# Altium footprint library MercurialSDR.PcbLib: 77 footprints (part 3 of 5)
Each footprint in its own frame and in the unit in brackets; x right, y up, seen from the top. Pads: shape width x height; smd on the part's side, far side on the other; paste and mask are expansions set on the pad; w line width, h text height; cw(c..) or ccw(c..) is an arc to the next point about the centre after c.
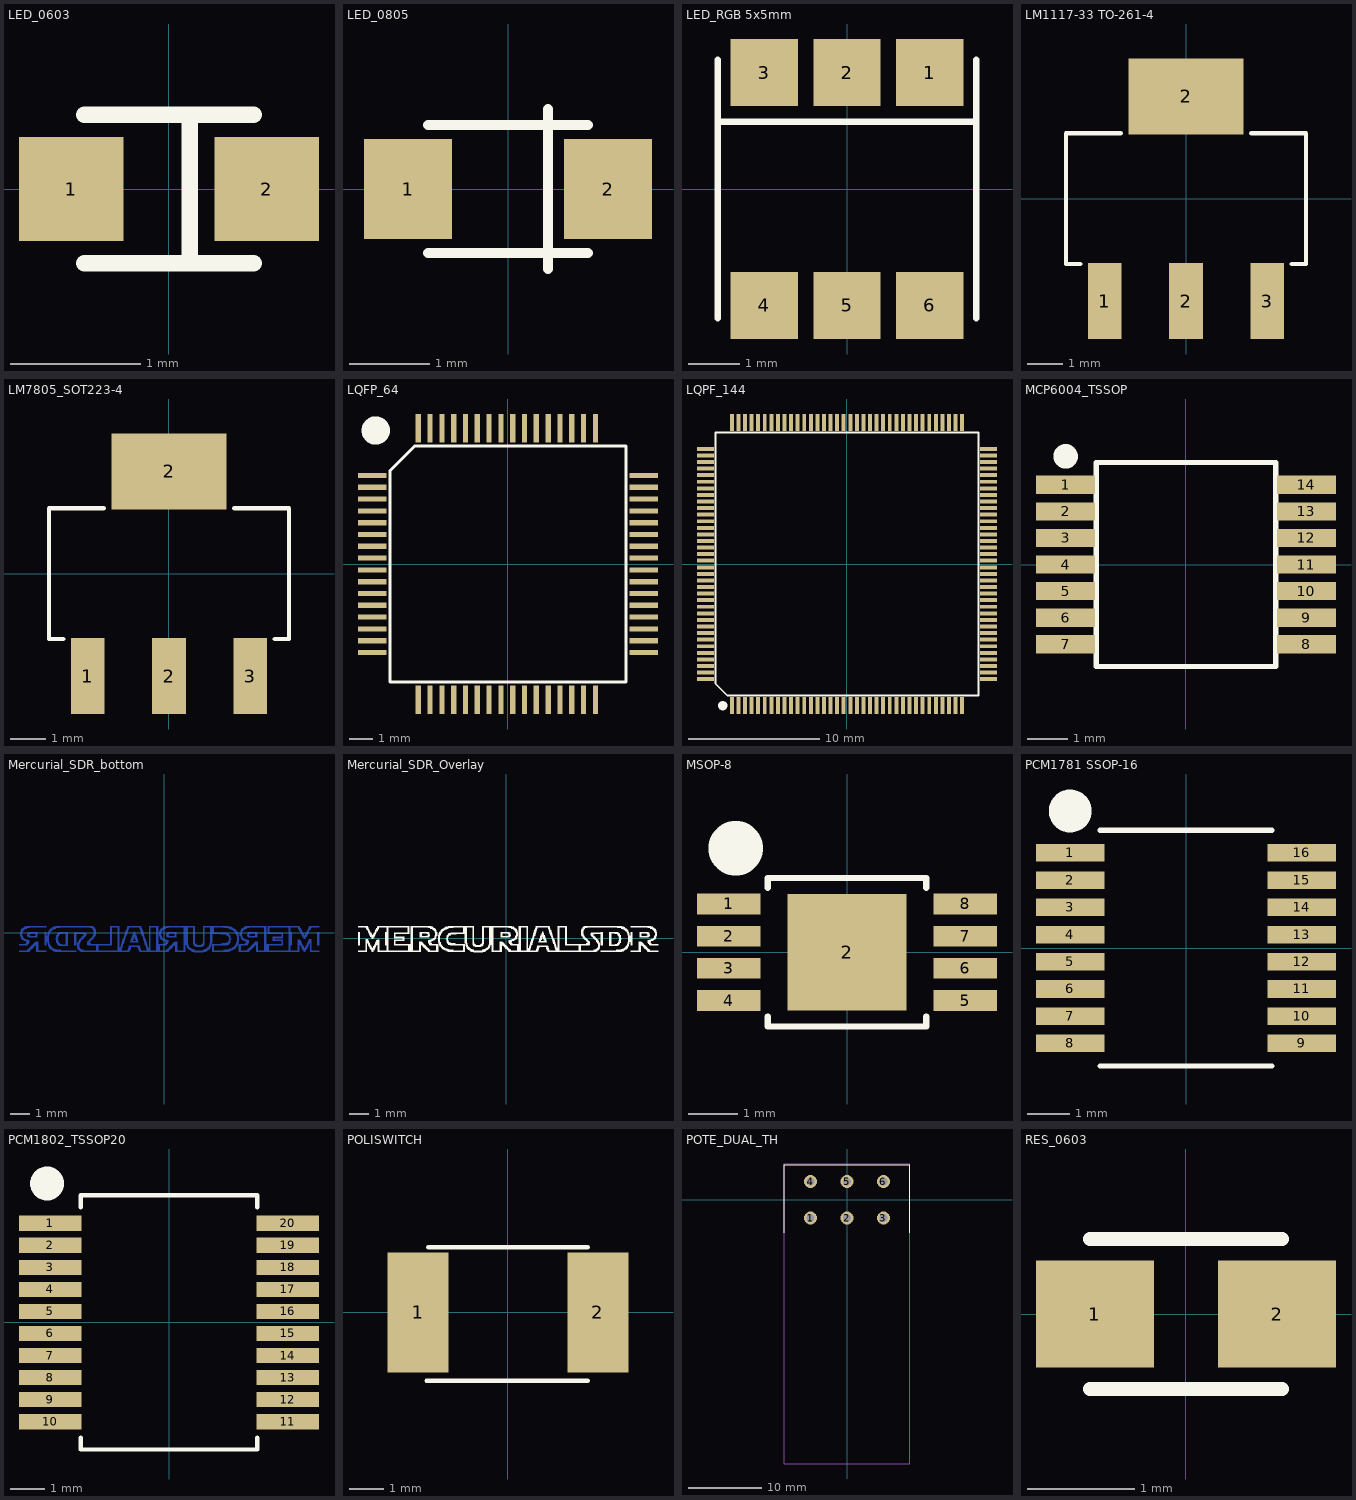
[diagram p2: the footprints below, top view; thin cyan lines are the x and y axes]

## LED_0603 [mm] "Led_0603"
pads (2):
  rect 0.8x0.8 smd: 1(-0.75,0) 2(0.75,0)
Top Overlay:
  lines w0.127: -0.65,-0.57 0.65,-0.57 ; -0.65,0.57 0.65,0.57 ; 0.16,-0.57 0.16,0.57
3D body "User Library-LED SMD 0603.step": height 0.65, standoff 0, extent -0.82,-0.4 0.88,0.4

## LED_0805 [mm] "Led 0805"
pads (2):
  rect 1.1x1.25 smd: 1(-1.25,0) 2(1.25,0)
Top Overlay:
  lines w0.127: -1,-0.8 1,-0.8 ; -1,0.8 1,0.8 ; 0.5,-1 0.5,1 ; 0.5,-0.75 0.5,0.7
3D body "User Library-LED-0805.step": height 0.9, standoff -0.01, extent -1.05,-0.675 1.05,0.675

## LED_RGB 5x5mm [mm] "Led RGB 5mm x 5mm"
pads (6):
  rect 1.3x1.3 smd: 1(1.6,2.25) 2(0,2.25) 3(-1.6,2.25) 4(-1.6,-2.25) 5(0,-2.25) 6(1.6,-2.25)
Top Overlay:
  lines w0.127: -2.5,-2.5 -2.5,2.5 ; -2.5,1.3 2.5,1.3 ; 2.5,-2.5 2.5,2.5
3D body "User Library-5050 RGB led.STEP": height 1.6, standoff 0, extent -2.45,-2.77 2.65,2.77

## LM1117-33 TO-261-4 [mm] "Regulador Lineal LM1117-33 TO-261-4"
pads (4):
  rect 0.95x2.15 smd: 1(-2.3,-2.9) 2(0,-2.9) 3(2.3,-2.9)
  rect 3.25x2.15 smd: 2(0,2.9)
Top Overlay:
  lines w0.127: -3,-1.85 -3.4,-1.85 -3.4,1.85 -1.85,1.85 ; 1.85,1.85 3.4,1.85 3.4,-1.85 3,-1.85
3D body "User Library- LM1117-SOT-223-1.step": height 1.69, standoff 0.04, extent -3.25,-3.5 3.25,3.5

## LM7805_SOT223-4 [mm] "Regulador Lineal 7805 SOT223-4"
pads (4):
  rect 0.95x2.15 smd: 1(-2.3,-2.9) 2(0,-2.9) 3(2.3,-2.9)
  rect 3.25x2.15 smd: 2(0,2.9)
Top Overlay:
  lines w0.127: -3,-1.85 -3.4,-1.85 -3.4,1.85 -1.85,1.85 ; 1.85,1.85 3.4,1.85 3.4,-1.85 3,-1.85
3D body "User Library- LM1117-SOT-223-1.step": height 1.69, standoff 0.04, extent -3.25,-3.5 3.25,3.5

## LQFP_64 [mm]
pads (64):
  rect 1.2x0.22 smd: 1(-5.75,3.75) 2(-5.75,3.25) 3(-5.75,2.75) 4(-5.75,2.25) 5(-5.75,1.75) 6(-5.75,1.25) 7(-5.75,0.75) 8(-5.75,0.25) 9(-5.75,-0.25) 10(-5.75,-0.75) 11(-5.75,-1.25) 12(-5.75,-1.75) 13(-5.75,-2.25) 14(-5.75,-2.75) 15(-5.75,-3.25) 16(-5.75,-3.75) 33(5.75,-3.75) 34(5.75,-3.25) 35(5.75,-2.75) 36(5.75,-2.25) 37(5.75,-1.75) 38(5.75,-1.25) 39(5.75,-0.75) 40(5.75,-0.25) 41(5.75,0.25) 42(5.75,0.75) 43(5.75,1.25) 44(5.75,1.75) 45(5.75,2.25) 46(5.75,2.75) 47(5.75,3.25) 48(5.75,3.75)
  rect 0.22x1.2 smd: 17(-3.8,-5.75) 18(-3.3,-5.75) 19(-2.8,-5.75) 20(-2.3,-5.75) 21(-1.8,-5.75) 22(-1.3,-5.75) 23(-0.8,-5.75) 24(-0.3,-5.75) 25(0.2,-5.75) 26(0.7,-5.75) 27(1.2,-5.75) 28(1.7,-5.75) 29(2.2,-5.75) 30(2.7,-5.75) 31(3.2,-5.75) 32(3.7,-5.75) 49(3.7,5.75) 50(3.2,5.75) 51(2.7,5.75) 52(2.2,5.75) 53(1.7,5.75) 54(1.2,5.75) 55(0.7,5.75) 56(0.2,5.75) 57(-0.3,5.75) 58(-0.8,5.75) 59(-1.3,5.75) 60(-1.8,5.75) 61(-2.3,5.75) 62(-2.8,5.75) 63(-3.3,5.75) 64(-3.8,5.75)
Top Overlay:
  circle w0.6: c-5.6,5.65 r0.3
  lines w0.127: 3.7,-5 5,-5 5,-3.65 5,5 -3.95,5 -5,3.95 -5,-3.8 -5,-5 3.75,-5
3D body "User Library-LQFP64-2.STEP": height 1.62, standoff -0.01, extent -6.122,-6.072 6.022,6.072

## LQPF_144 [mm] "LQPF_144"
height 0.002
pads (144):
  rect 0.3x1.3 smd: 1(-8.75,-10.75) 2(-8.25,-10.75) 3(-7.75,-10.75) 4(-7.25,-10.75) 5(-6.75,-10.75) 6(-6.25,-10.75) 7(-5.75,-10.75) 8(-5.25,-10.75) 9(-4.75,-10.75) 10(-4.25,-10.75) 11(-3.75,-10.75) 12(-3.25,-10.75) 13(-2.75,-10.75) 14(-2.25,-10.75) 15(-1.75,-10.75) 16(-1.25,-10.75) 17(-0.75,-10.75) 18(-0.25,-10.75) 19(0.25,-10.75) 20(0.75,-10.75) 21(1.25,-10.75) 22(1.75,-10.75) 23(2.25,-10.75) 24(2.75,-10.75) 25(3.25,-10.75) 26(3.75,-10.75) 27(4.25,-10.75) 28(4.75,-10.75) 29(5.25,-10.75) 30(5.75,-10.75) 31(6.25,-10.75) 32(6.75,-10.75) 33(7.25,-10.75) 34(7.75,-10.75) 35(8.25,-10.75) 36(8.75,-10.75) 73(8.75,10.75) 74(8.25,10.75) 75(7.75,10.75) 76(7.25,10.75) 77(6.75,10.75) 78(6.25,10.75) 79(5.75,10.75) 80(5.25,10.75) 81(4.75,10.75) 82(4.25,10.75) 83(3.75,10.75) 84(3.25,10.75) 85(2.75,10.75) 86(2.25,10.75) 87(1.75,10.75) 88(1.25,10.75) 89(0.75,10.75) 90(0.25,10.75) 91(-0.25,10.75) 92(-0.75,10.75) 93(-1.25,10.75) 94(-1.75,10.75) 95(-2.25,10.75) 96(-2.75,10.75) 97(-3.25,10.75) 98(-3.75,10.75) 99(-4.25,10.75) 100(-4.75,10.75) 101(-5.25,10.75) 102(-5.75,10.75) 103(-6.25,10.75) 104(-6.75,10.75) 105(-7.25,10.75) 106(-7.75,10.75) 107(-8.25,10.75) 108(-8.75,10.75)
  rect 1.3x0.3 smd: 37(10.75,-8.75) 38(10.75,-8.25) 39(10.75,-7.75) 40(10.75,-7.25) 41(10.75,-6.75) 42(10.75,-6.25) 43(10.75,-5.75) 44(10.75,-5.25) 45(10.75,-4.75) 46(10.75,-4.25) 47(10.75,-3.75) 48(10.75,-3.25) 49(10.75,-2.75) 50(10.75,-2.25) 51(10.75,-1.75) 52(10.75,-1.25) 53(10.75,-0.75) 54(10.75,-0.25) 55(10.75,0.25) 56(10.75,0.75) 57(10.75,1.25) 58(10.75,1.75) 59(10.75,2.25) 60(10.75,2.75) 61(10.75,3.25) 62(10.75,3.75) 63(10.75,4.25) 64(10.75,4.75) 65(10.75,5.25) 66(10.75,5.75) 67(10.75,6.25) 68(10.75,6.75) 69(10.75,7.25) 70(10.75,7.75) 71(10.75,8.25) 72(10.75,8.75) 109(-10.75,8.75) 110(-10.75,8.25) 111(-10.75,7.75) 112(-10.75,7.25) 113(-10.75,6.75) 114(-10.75,6.25) 115(-10.75,5.75) 116(-10.75,5.25) 117(-10.75,4.75) 118(-10.75,4.25) 119(-10.75,3.75) 120(-10.75,3.25) 121(-10.75,2.75) 122(-10.75,2.25) 123(-10.75,1.75) 124(-10.75,1.25) 125(-10.75,0.75) 126(-10.75,0.25) 127(-10.75,-0.25) 128(-10.75,-0.75) 129(-10.75,-1.25) 130(-10.75,-1.75) 131(-10.75,-2.25) 132(-10.75,-2.75) 133(-10.75,-3.25) 134(-10.75,-3.75) 135(-10.75,-4.25) 136(-10.75,-4.75) 137(-10.75,-5.25) 138(-10.75,-5.75) 139(-10.75,-6.25) 140(-10.75,-6.75) 141(-10.75,-7.25) 142(-10.75,-7.75) 143(-10.75,-8.25) 144(-10.75,-8.75)
Top Overlay:
  lines w0.127: -10,-9.1 -9.1,-10 10,-10 10,10 -10,10 -10,8.75 -10,-9.1
  lines w0.7: -9.451,-10.773 ccw(c-9.75,-10.75) -9.45,-10.75
3D body "User Library-LQFP144_STM32F4.STEP": height 2, standoff 0.1, extent -11,-11 11,11

## MCP6004_TSSOP [mm] "TSSOP de MCP6004"
pads (14):
  rect 1.45x0.45 smd: 1(-2.95,1.95) 2(-2.95,1.3) 3(-2.95,0.65) 4(-2.95,0) 5(-2.95,-0.65) 6(-2.95,-1.3) 7(-2.95,-1.95) 8(2.95,-1.95) 9(2.95,-1.3) 10(2.95,-0.65) 11(2.95,0) 12(2.95,0.65) 13(2.95,1.3) 14(2.95,1.95)
Top Overlay:
  circle w0.5: c-2.95,2.65 r0.05
  lines w0.127: -2.2,-2.5 2.2,-2.5 2.2,2.5 -2.2,2.5 -2.2,-2.5
3D body "User Library-TSSOP-14.STEP": height 1.2, standoff 0, extent -3.15,-2.5 3.25,2.5

## Mercurial_SDR_bottom [mm]
Bottom Layer:
  lines w0.03: -7.461,-0.95 -6.942,-0.95 ; -7.461,-0.919 -6.912,-0.919 ; -7.461,-0.614 -7.034,-0.614 ; -7.461,-0.584 -7.003,-0.584 ; -7.4,-0.127 -7.308,-0.127 ; -7.4,-0.096 -7.308,-0.096 ; -7.4,-0.066 -7.308,-0.066 ; -7.4,-0.035 -7.308,-0.035 ; -7.4,-0.005 -7.308,-0.005 ; -7.4,0.026 -7.308,0.026 ; -7.369,-0.218 -7.278,-0.218 ; -7.369,-0.188 -7.278,-0.188 ; -7.369,-0.157 -7.278,-0.157 ; -7.369,0.056 -7.278,0.056 ; -7.369,0.087 -7.278,0.087 ; -7.369,0.117 -7.247,0.117 ; -7.339,-0.279 -7.217,-0.279 ; -7.339,-0.249 -7.247,-0.249 ; -7.339,0.148 -7.217,0.148 ; -7.339,0.178 -7.186,0.178 ; -7.308,-0.31 -7.186,-0.31 ; -7.308,0.209 -7.156,0.209 ; -7.278,-0.34 -7.125,-0.34 ; -7.278,0.239 -7.064,0.239 ; -7.247,-0.371 -7.034,-0.371 ; -7.217,0.27 -6.942,0.27 ; -7.186,-0.401 -6.942,-0.401 ; -7.186,0.3 -6.059,0.3 ; -7.125,-0.553 -6.973,-0.553 ; -7.095,-0.523 -6.973,-0.523 ; -7.095,-0.432 -6.942,-0.432 ; -7.095,0.33 -6.059,0.33 ; -7.064,-0.492 -6.942,-0.492 ; -7.034,-0.889 -6.882,-0.889 ; -7.034,-0.462 -6.942,-0.462 ; -7.034,-0.127 -6.942,-0.127 ; -7.034,-0.096 -6.942,-0.096 ; -7.003,-0.858 -6.851,-0.858 ; -7.003,-0.188 -6.516,-0.188 ; -7.003,-0.157 -6.882,-0.157 ; -7.003,-0.066 -6.912,-0.066 ; -7.003,-0.035 -6.882,-0.035 ; -7.003,-0.005 -6.516,-0.005 ; -6.973,-0.828 -6.821,-0.828 ; -6.973,-0.218 -6.516,-0.218 ; -6.973,0.026 -6.516,0.026 ; -6.942,-0.797 -6.79,-0.797 ; -6.912,-0.767 -6.76,-0.767 ; -6.882,-0.736 -6.729,-0.736 ; -6.851,-0.706 -6.699,-0.706 ; -6.821,-0.675 -6.668,-0.675 ; -6.79,-0.645 -6.638,-0.645 ; -6.76,-0.614 -6.607,-0.614 ; -6.729,-0.584 -6.485,-0.584 ; -6.699,-0.553 -6.485,-0.553 ; -6.668,-0.523 -6.485,-0.523 ; -6.638,-0.492 -6.485,-0.492 ; -6.607,-0.462 -6.485,-0.462 ; -6.607,-0.157 -6.516,-0.157 ; -6.607,-0.127 -6.516,-0.127 ; -6.607,-0.096 -6.516,-0.096 ; -6.607,-0.066 -6.516,-0.066 ; -6.607,-0.035 -6.516,-0.035 ; -6.577,-0.95 -6.059,-0.95 ; -6.577,-0.919 -6.059,-0.919 ; -6.577,-0.889 -6.485,-0.889 ; -6.577,-0.858 -6.485,-0.858 ; -6.577,-0.828 -6.485,-0.828 ; -6.577,-0.797 -6.485,-0.797 ; -6.577,-0.767 -6.485,-0.767 ; -6.577,-0.736 -6.485,-0.736 ; -6.577,-0.706 -6.485,-0.706 ; -6.577,-0.675 -6.485,-0.675 ; -6.577,-0.645 -6.485,-0.645 ; -6.577,-0.614 -6.485,-0.614 ; -6.15,-0.614 -6.059,-0.614 ; -6.15,-0.584 -6.059,-0.584 ; -6.15,-0.553 -6.059,-0.553 ; -6.15,-0.523 -6.059,-0.523 ; -6.15,-0.492 -6.059,-0.492 ; -6.15,-0.462 -6.059,-0.462 ; -6.15,-0.432 -6.059,-0.432 ; -6.15,-0.401 -6.059,-0.401 ; -6.15,-0.371 -6.059,-0.371 ; -6.15,-0.34 -6.059,-0.34 ; -6.15,-0.31 -6.059,-0.31 ; -6.15,-0.279 -6.059,-0.279 ; -6.15,-0.249 -6.059,-0.249 ; -6.15,-0.218 -6.059,-0.218 ; -6.15,-0.188 -6.059,-0.188 ; -6.15,-0.157 -6.059,-0.157 ; -6.15,-0.127 -6.059,-0.127 ; -6.15,-0.096 -6.059,-0.096 ; -6.15,-0.066 -6.059,-0.066 ; -6.15,-0.035 -6.059,-0.035 ; -6.15,-0.005 -6.059,-0.005 ; -6.15,0.026 -6.059,0.026 ; -6.028,-0.432 -5.937,-0.432 ; -6.028,-0.401 -5.937,-0.401 ; -6.028,-0.371 -5.937,-0.371 ; -6.028,-0.34 -5.937,-0.34 ; -6.028,-0.31 -5.937,-0.31 ; -6.028,-0.279 -5.937,-0.279 ; -6.028,-0.249 -5.937,-0.249 ; -6.028,-0.218 -5.937,-0.218 ; -6.028,-0.188 -5.937,-0.188 ; -6.028,-0.157 -5.937,-0.157 ; -5.998,-0.553 -5.906,-0.553 ; -5.998,-0.523 -5.906,-0.523 ; -5.998,-0.492 -5.906,-0.492 ; -5.998,-0.462 -5.937,-0.462 ; -5.998,-0.127 -5.937,-0.127 ; -5.998,-0.096 -5.906,-0.096 ; -5.998,-0.066 -5.906,-0.066 ; -5.998,-0.035 -5.906,-0.035 ; -5.967,-0.645 -5.845,-0.645 ; -5.967,-0.614 -5.876,-0.614 ; -5.967,-0.584 -5.876,-0.584 ; -5.967,-0.005 -5.876,-0.005 ; -5.967,0.026 -5.876,0.026 ; -5.937,-0.706 -5.815,-0.706 ; -5.937,-0.675 -5.845,-0.675 ; -5.937,0.056 -5.845,0.056 ; -5.937,0.087 -5.815,0.087 ; -5.906,-0.736 -5.784,-0.736 ; -5.906,0.117 -5.784,0.117 ; -5.876,-0.797 -5.723,-0.797 ; -5.876,-0.767 -5.754,-0.767 ; -5.876,0.148 -5.754,0.148 ; -5.876,0.178 -5.723,0.178 ; -5.845,-0.828 -5.662,-0.828 ; -5.845,0.209 -5.662,0.209 ; -5.784,-0.858 -5.571,-0.858 ; -5.784,0.239 -5.571,0.239 ; -5.754,-0.889 -5.327,-0.889 ; -5.754,0.27 -5.358,0.27 ; -5.693,-0.919 -4.535,-0.919 ; -5.693,0.3 -4.535,0.3 ; -5.601,-0.95 -4.535,-0.95 ; -5.601,0.33 -4.535,0.33 ; -5.571,-0.31 -5.479,-0.31 ; -5.571,-0.279 -5.479,-0.279 ; -5.54,-0.492 -5.418,-0.492 ; -5.54,-0.462 -5.449,-0.462 ; -5.54,-0.432 -5.449,-0.432 ; -5.54,-0.401 -5.449,-0.401 ; -5.54,-0.371 -5.479,-0.371 ; -5.54,-0.34 -5.479,-0.34 ; -5.54,-0.249 -5.479,-0.249 ; -5.54,-0.218 -5.449,-0.218 ; -5.54,-0.188 -5.449,-0.188 ; -5.54,-0.157 -5.449,-0.157 ; -5.54,-0.127 -5.418,-0.127 ; -5.51,-0.553 -5.358,-0.553 ; -5.51,-0.523 -5.418,-0.523 ; -5.51,-0.096 -5.388,-0.096 ; -5.51,-0.066 -5.358,-0.066 ; -5.479,-0.584 -5.266,-0.584 ; -5.479,-0.035 -5.236,-0.035 ; -5.449,-0.614 -4.961,-0.614 ; -5.449,-0.005 -4.961,-0.005 ; -5.388,-0.645 -4.961,-0.645 ; -5.388,0.026 -4.961,0.026 ; -5.053,-0.584 -4.961,-0.584 ; -5.053,-0.553 -4.961,-0.553 ; -5.053,-0.523 -4.961,-0.523 ; -5.053,-0.492 -4.961,-0.492 ; -5.053,-0.462 -4.961,-0.462 ; -5.053,-0.432 -4.961,-0.432 ; -5.053,-0.401 -4.961,-0.401 ; -5.053,-0.371 -4.961,-0.371 ; -5.053,-0.34 -4.961,-0.34 ; -5.053,-0.31 -4.961,-0.31 ; -5.053,-0.279 -4.961,-0.279 ; -5.053,-0.249 -4.961,-0.249 ; -5.053,-0.218 -4.961,-0.218 ; -5.053,-0.188 -4.961,-0.188 ; -5.053,-0.157 -4.961,-0.157 ; -5.053,-0.127 -4.961,-0.127 ; -5.053,-0.096 -4.961,-0.096 ; -5.053,-0.066 -4.961,-0.066 ; -5.053,-0.035 -4.961,-0.035 ; -4.626,-0.614 -4.535,-0.614 ; -4.626,-0.584 -4.535,-0.584 ; -4.626,-0.553 -4.535,-0.553 ; -4.626,-0.523 -4.535,-0.523 ; -4.626,-0.492 -4.535,-0.492 ; -4.626,-0.462 -4.535,-0.462 ; -4.626,-0.432 -4.535,-0.432 ; -4.626,-0.401 -4.535,-0.401 ; -4.626,-0.371 -4.535,-0.371 ; -4.626,-0.34 -4.535,-0.34 ; -4.626,-0.31 -4.535,-0.31 ; -4.626,-0.279 -4.535,-0.279 ; -4.626,-0.249 -4.535,-0.249 ; -4.626,-0.218 -4.535,-0.218 ; -4.626,-0.188 -4.535,-0.188 ; -4.626,-0.157 -4.535,-0.157 ; -4.626,-0.127 -4.535,-0.127 ; -4.626,-0.096 -4.535,-0.096 ; -4.626,-0.066 -4.535,-0.066 ; -4.626,-0.035 -4.535,-0.035 ; -4.626,-0.005 -4.535,-0.005 ; -4.626,0.026 -4.535,0.026 ; -4.504,-0.035 -4.016,-0.035 ; -4.504,-0.005 -4.047,-0.005 ; -4.504,0.3 -3.62,0.3 ; -4.504,0.33 -3.681,0.33 ; -4.474,-0.767 -4.352,-0.767 ; -4.474,-0.736 -4.382,-0.736 ; -4.474,-0.706 -4.382,-0.706 ; -4.474,-0.675 -4.382,-0.675 ; -4.474,-0.645 -4.382,-0.645 ; -4.474,-0.614 -4.382,-0.614 ; -4.474,-0.584 -4.382,-0.584 ; -4.474,-0.553 -4.382,-0.553 ; -4.443,-0.828 -4.291,-0.828 ; -4.443,-0.797 -4.352,-0.797 ; -4.443,-0.523 -4.352,-0.523 ; -4.443,-0.492 -4.352,-0.492 ; -4.413,-0.858 -4.26,-0.858 ; -4.413,-0.462 -4.321,-0.462 ; -4.413,-0.432 -4.291,-0.432 ; -4.382,-0.889 -4.169,-0.889 ; -4.382,-0.401 -4.291,-0.401 ; -4.382,-0.371 -4.26,-0.371 ; -4.352,-0.919 -1.791,-0.919 ; -4.352,-0.34 -4.23,-0.34 ; -4.321,-0.31 -4.199,-0.31 ; -4.291,-0.95 -1.791,-0.95 ; -4.291,-0.279 -4.169,-0.279 ; -4.26,-0.249 -4.138,-0.249 ; -4.23,-0.218 -4.108,-0.218 ; -4.199,-0.188 -4.077,-0.188 ; -4.199,-0.066 -4.016,-0.066 ; -4.169,-0.157 -4.047,-0.157 ; -4.138,-0.127 -4.047,-0.127 ; -4.108,-0.096 -4.016,-0.096 ; -3.955,-0.584 -2.706,-0.584 ; -3.955,-0.553 -3.773,-0.553 ; -3.955,-0.523 -3.864,-0.523 ; -3.955,-0.492 -3.864,-0.492 ; -3.955,-0.462 -3.834,-0.462 ; -3.925,-0.614 -2.706,-0.614 ; -3.925,-0.432 -3.803,-0.432 ; -3.894,-0.401 -3.773,-0.401 ; -3.864,-0.371 -3.742,-0.371 ; -3.834,-0.34 -3.712,-0.34 ; -3.834,0.27 -3.59,0.27 ; -3.803,-0.31 -3.681,-0.31 ; -3.773,-0.279 -3.651,-0.279 ; -3.742,-0.249 -3.62,-0.249 ; -3.712,-0.218 -3.59,-0.218 ; -3.712,0.239 -3.59,0.239 ; -3.681,-0.188 -3.59,-0.188 ; -3.681,-0.157 -3.559,-0.157 ; -3.681,0.209 -3.559,0.209 ; -3.651,-0.127 -3.559,-0.127 ; -3.651,-0.096 -3.529,-0.096 ; -3.651,0.148 -3.529,0.148 ; -3.651,0.178 -3.559,0.178 ; -3.62,-0.066 -3.529,-0.066 ; -3.62,-0.035 -3.529,-0.035 ; -3.62,-0.005 -3.529,-0.005 ; -3.62,0.026 -3.529,0.026 ; -3.62,0.056 -3.529,0.056 ; -3.62,0.087 -3.529,0.087 ; -3.62,0.117 -3.529,0.117 ; -3.498,-0.889 -3.407,-0.889 ; -3.498,-0.858 -3.407,-0.858 ; -3.498,-0.828 -3.407,-0.828 ; -3.498,-0.797 -3.407,-0.797 ; -3.498,-0.767 -3.407,-0.767 ; -3.498,-0.736 -3.407,-0.736 ; -3.498,-0.706 -3.407,-0.706 ; -3.498,-0.675 -3.407,-0.675 ; -3.498,-0.645 -3.407,-0.645 ; -2.767,-0.553 -2.706,-0.553 ; -2.767,-0.523 -2.706,-0.523 ; -2.767,-0.492 -2.706,-0.492 ; -2.767,-0.462 -2.706,-0.462 ; -2.767,-0.432 -2.706,-0.432 ; -2.767,-0.401 -2.706,-0.401 ; -2.767,-0.371 -2.706,-0.371 ; -2.767,-0.34 -2.706,-0.34 ; -2.767,-0.31 -2.706,-0.31 ; -2.767,-0.279 -2.706,-0.279 ; -2.767,-0.249 -2.706,-0.249 ; -2.767,-0.218 -2.706,-0.218 ; -2.767,-0.188 -2.706,-0.188 ; -2.767,-0.157 -2.706,-0.157 ; -2.767,-0.127 -2.706,-0.127 ; -2.767,-0.096 -2.706,-0.096 ; -2.767,-0.066 -2.706,-0.066 ; -2.767,-0.035 -2.706,-0.035 ; -2.767,-0.005 -2.706,-0.005 ; -2.767,0.026 -2.706,0.026 ; -2.767,0.056 -2.706,0.056 ; -2.767,0.087 -2.706,0.087 ; -2.767,0.117 -2.706,0.117 ; -2.767,0.148 -2.706,0.148 ; -2.767,0.178 -2.706,0.178 ; -2.767,0.209 -2.706,0.209 ; -2.767,0.239 -2.706,0.239 ; -2.767,0.27 -2.706,0.27 ; -2.767,0.3 -2.31,0.3 ; -2.767,0.33 -2.31,0.33 ; -2.401,-0.889 -2.218,-0.889 ; -2.401,-0.858 -2.218,-0.858 ; -2.401,-0.828 -2.31,-0.828 ; -2.401,-0.797 -2.31,-0.797 ; -2.401,-0.767 -2.31,-0.767 ; -2.401,-0.736 -2.31,-0.736 ; -2.401,-0.706 -2.31,-0.706 ; -2.401,-0.675 -2.31,-0.675 ; -2.401,-0.645 -2.31,-0.645 ; -2.401,-0.614 -2.31,-0.614 ; -2.401,-0.584 -2.31,-0.584 ; -2.401,-0.553 -2.31,-0.553 ; -2.401,-0.523 -2.31,-0.523 ; -2.401,-0.492 -2.31,-0.492 ; -2.401,-0.462 -2.31,-0.462 ; -2.401,-0.432 -2.31,-0.432 ; -2.401,-0.401 -2.31,-0.401 ; -2.401,-0.371 -2.31,-0.371 ; -2.401,-0.34 -2.31,-0.34 ; -2.401,-0.31 -2.31,-0.31 ; -2.401,-0.279 -2.31,-0.279 ; -2.401,-0.249 -2.31,-0.249 ; -2.401,-0.218 -2.31,-0.218 ; -2.401,-0.188 -2.31,-0.188 ; -2.401,-0.157 -2.31,-0.157 ; -2.401,-0.127 -2.31,-0.127 ; -2.401,-0.096 -2.31,-0.096 ; -2.401,-0.066 -2.31,-0.066 ; -2.401,-0.035 -2.31,-0.035 ; -2.401,-0.005 -2.31,-0.005 ; -2.401,0.026 -2.31,0.026 ; -2.401,0.056 -2.31,0.056 ; -2.401,0.087 -2.31,0.087 ; -2.401,0.117 -2.31,0.117 ; -2.401,0.148 -2.31,0.148 ; -2.401,0.178 -2.31,0.178 ; -2.401,0.209 -2.31,0.209 ; -2.401,0.239 -2.31,0.239 ; -2.401,0.27 -2.31,0.27 ; -2.279,-0.828 -2.188,-0.828 ; -2.279,-0.797 -2.188,-0.797 ; -2.279,-0.767 -2.188,-0.767 ; -2.249,-0.736 -2.157,-0.736 ; -2.249,-0.706 -2.157,-0.706 ; -2.249,-0.675 -2.157,-0.675 ; -2.218,-0.645 -2.127,-0.645 ; -2.218,-0.614 -2.127,-0.614 ; -2.218,-0.584 -2.127,-0.584 ; -2.188,-0.553 -2.096,-0.553 ; -2.188,-0.523 -2.096,-0.523 ; -2.188,-0.492 -2.096,-0.492 ; -2.157,-0.462 -2.066,-0.462 ; -2.157,-0.432 -2.066,-0.432 ; -2.157,-0.401 -2.066,-0.401 ; -2.127,-0.371 -2.035,-0.371 ; -2.127,-0.34 -2.035,-0.34 ; -2.127,-0.31 -2.035,-0.31 ; -2.096,-0.279 -2.005,-0.279 ; -2.096,-0.249 -2.005,-0.249 ; -2.066,-0.218 -2.005,-0.218 ; -2.066,-0.188 -1.974,-0.188 ; -2.066,-0.157 -1.974,-0.157 ; -2.035,-0.127 -1.974,-0.127 ; -2.035,-0.096 -1.944,-0.096 ; -2.035,-0.066 -1.944,-0.066 ; -2.005,-0.035 -1.913,-0.035 ; -2.005,-0.005 -1.913,-0.005 ; -2.005,0.026 -1.913,0.026 ; -1.974,0.056 -1.883,0.056 ; -1.974,0.087 -1.883,0.087 ; -1.974,0.117 -1.883,0.117 ; -1.944,0.148 -1.852,0.148 ; -1.944,0.178 -1.852,0.178 ; -1.944,0.209 -1.852,0.209 ; -1.913,0.239 -1.822,0.239 ; -1.913,0.27 -1.822,0.27 ; -1.913,0.3 -1.182,0.3 ; -1.883,-0.889 -1.761,-0.889 ; -1.883,0.33 -1.182,0.33 ; -1.852,-0.858 -1.761,-0.858 ; -1.852,-0.828 -1.761,-0.828 ; -1.852,-0.797 -1.73,-0.797 ; -1.822,-0.767 -1.73,-0.767 ; -1.822,-0.736 -1.73,-0.736 ; -1.822,-0.706 -1.273,-0.706 ; -1.791,-0.675 -1.273,-0.675 ; -1.761,-0.462 -1.334,-0.462 ; -1.73,-0.432 -1.334,-0.432 ; -1.73,-0.401 -1.639,-0.401 ; -1.73,-0.371 -1.608,-0.371 ; -1.7,-0.34 -1.608,-0.34 ; -1.7,-0.31 -1.608,-0.31 ; -1.669,-0.279 -1.578,-0.279 ; -1.669,-0.249 -1.578,-0.249 ; -1.669,-0.218 -1.578,-0.218 ; -1.639,-0.188 -1.426,-0.188 ; -1.639,-0.157 -1.456,-0.157 ; -1.639,-0.127 -1.456,-0.127 ; -1.608,-0.096 -1.456,-0.096 ; -1.608,-0.066 -1.487,-0.066 ; -1.608,-0.035 -1.487,-0.035 ; -1.578,-0.005 -1.517,-0.005 ; -1.578,0.026 -1.517,0.026 ; -1.578,0.056 -1.517,0.056 ; -1.517,-0.279 -1.395,-0.279 ; -1.517,-0.249 -1.426,-0.249 ; -1.517,-0.218 -1.426,-0.218 ; -1.487,-0.34 -1.365,-0.34 ; -1.487,-0.31 -1.395,-0.31 ; -1.456,-0.401 -1.365,-0.401 ; -1.456,-0.371 -1.365,-0.371 ; -1.365,-0.736 -1.273,-0.736 ; -1.334,-0.828 -1.243,-0.828 ; -1.334,-0.797 -1.243,-0.797 ; -1.334,-0.767 -1.243,-0.767 ; -1.304,-0.919 0.22,-0.919 ; -1.304,-0.889 -1.212,-0.889 ; -1.304,-0.858 -1.212,-0.858 ; -1.273,-0.95 0.19,-0.95 ; -1.273,0.239 -1.151,0.239 ; -1.273,0.27 -1.182,0.27 ; -1.243,0.148 -1.121,0.148 ; -1.243,0.178 -1.151,0.178 ; -1.243,0.209 -1.151,0.209 ; -1.212,0.056 -1.09,0.056 ; -1.212,0.087 -1.121,0.087 ; -1.212,0.117 -1.121,0.117 ; -1.182,-0.035 -1.09,-0.035 ; -1.182,-0.005 -1.09,-0.005 ; -1.182,0.026 -1.09,0.026 ; -1.151,-0.127 -1.06,-0.127 ; -1.151,-0.096 -1.06,-0.096 ; -1.151,-0.066 -1.06,-0.066 ; -1.121,-0.218 -1.029,-0.218 ; -1.121,-0.188 -1.029,-0.188 ; -1.121,-0.157 -1.029,-0.157 ; -1.09,-0.31 -0.999,-0.31 ; -1.09,-0.279 -0.999,-0.279 ; -1.09,-0.249 -0.999,-0.249 ; -1.06,-0.401 -0.968,-0.401 ; -1.06,-0.371 -0.968,-0.371 ; -1.06,-0.34 -0.968,-0.34 ; -1.029,-0.492 -0.938,-0.492 ; -1.029,-0.462 -0.938,-0.462 ; -1.029,-0.432 -0.938,-0.432 ; -0.999,-0.584 -0.907,-0.584 ; -0.999,-0.553 -0.907,-0.553 ; -0.999,-0.523 -0.907,-0.523 ; -0.968,-0.675 -0.877,-0.675 ; -0.968,-0.645 -0.877,-0.645 ; -0.968,-0.614 -0.877,-0.614 ; -0.938,-0.767 -0.846,-0.767 ; -0.938,-0.736 -0.846,-0.736 ; -0.938,-0.706 -0.846,-0.706 ; -0.907,-0.858 -0.816,-0.858 ; -0.907,-0.828 -0.816,-0.828 ; -0.907,-0.797 -0.816,-0.797 ; -0.877,-0.889 -0.725,-0.889 ; -0.786,-0.858 -0.725,-0.858 ; -0.786,-0.828 -0.725,-0.828 ; -0.786,-0.797 -0.725,-0.797 ; -0.786,-0.767 -0.725,-0.767 ; -0.786,-0.736 -0.725,-0.736 ; -0.786,-0.706 -0.725,-0.706 ; -0.786,-0.675 -0.725,-0.675 ; -0.786,-0.645 -0.725,-0.645 ; -0.786,-0.614 -0.725,-0.614 ; -0.786,-0.584 -0.725,-0.584 ; -0.786,-0.553 -0.725,-0.553 ; -0.786,-0.523 -0.725,-0.523 ; -0.786,-0.492 -0.725,-0.492 ; -0.786,-0.462 -0.725,-0.462 ; -0.786,-0.432 -0.725,-0.432 ; -0.786,-0.401 -0.725,-0.401 ; -0.786,-0.371 -0.725,-0.371 ; -0.786,-0.34 -0.725,-0.34 ; -0.786,-0.31 -0.725,-0.31 ; -0.786,-0.279 -0.725,-0.279 ; -0.786,-0.249 -0.725,-0.249 ; -0.786,-0.218 -0.725,-0.218 ; -0.786,-0.188 -0.725,-0.188 ; -0.786,-0.157 -0.725,-0.157 ; -0.786,-0.127 -0.725,-0.127 ; -0.786,-0.096 -0.725,-0.096 ; -0.786,-0.066 -0.725,-0.066 ; -0.786,-0.035 -0.725,-0.035 ; -0.786,-0.005 -0.725,-0.005 ; -0.786,0.026 -0.725,0.026 ; -0.786,0.056 -0.725,0.056 ; -0.786,0.087 -0.725,0.087 ; -0.786,0.117 -0.725,0.117 ; -0.786,0.148 -0.725,0.148 ; -0.786,0.178 -0.725,0.178 ; -0.786,0.209 -0.725,0.209 ; -0.786,0.239 -0.725,0.239 ; -0.786,0.27 -0.725,0.27 ; -0.786,0.3 -0.328,0.3 ; -0.786,0.33 -0.328,0.33 ; -0.42,-0.889 -0.237,-0.889 ; -0.42,-0.858 -0.237,-0.858 ; -0.42,-0.828 -0.237,-0.828 ; -0.42,-0.797 -0.237,-0.797 ; -0.42,-0.767 -0.237,-0.767 ; -0.42,-0.736 -0.237,-0.736 ; -0.42,-0.706 -0.237,-0.706 ; -0.42,-0.675 -0.237,-0.675 ; -0.42,-0.645 -0.237,-0.645 ; -0.42,-0.614 0.098,-0.614 ; -0.42,-0.584 0.129,-0.584 ; -0.42,-0.553 -0.328,-0.553 ; -0.42,-0.523 -0.328,-0.523 ; -0.42,-0.492 -0.328,-0.492 ; -0.42,-0.462 -0.328,-0.462 ; -0.42,-0.432 -0.328,-0.432 ; -0.42,-0.401 -0.328,-0.401 ; -0.42,-0.371 -0.328,-0.371 ; -0.42,-0.34 -0.328,-0.34 ; -0.42,-0.31 -0.328,-0.31 ; -0.42,-0.279 -0.328,-0.279 ; -0.42,-0.249 -0.328,-0.249 ; -0.42,-0.218 -0.328,-0.218 ; -0.42,-0.188 -0.328,-0.188 ; -0.42,-0.157 -0.328,-0.157 ; -0.42,-0.127 -0.328,-0.127 ; -0.42,-0.096 -0.328,-0.096 ; -0.42,-0.066 -0.328,-0.066 ; -0.42,-0.035 -0.328,-0.035 ; -0.42,-0.005 -0.328,-0.005 ; -0.42,0.026 -0.328,0.026 ; -0.42,0.056 -0.328,0.056 ; -0.42,0.087 -0.328,0.087 ; -0.42,0.117 -0.328,0.117 ; -0.42,0.148 -0.328,0.148 ; -0.42,0.178 -0.328,0.178 ; -0.42,0.209 -0.328,0.209 ; -0.42,0.239 -0.328,0.239 ; -0.42,0.27 -0.328,0.27 ; -0.267,-0.127 -0.176,-0.127 ; -0.267,-0.096 -0.176,-0.096 ; -0.267,-0.066 -0.176,-0.066 ; -0.267,-0.035 -0.176,-0.035 ; -0.267,-0.005 -0.176,-0.005 ; -0.267,0.026 -0.176,0.026 ; -0.237,-0.218 -0.145,-0.218 ; -0.237,-0.188 -0.145,-0.188 ; -0.237,-0.157 -0.145,-0.157 ; -0.237,0.056 -0.145,0.056 ; -0.237,0.087 -0.145,0.087 ; -0.237,0.117 -0.115,0.117 ; -0.206,-0.279 -0.084,-0.279 ; -0.206,-0.249 -0.115,-0.249 ; -0.206,0.148 -0.084,0.148 ; -0.206,0.178 -0.054,0.178 ; -0.176,-0.31 -0.054,-0.31 ; -0.176,0.209 -0.024,0.209 ; -0.145,-0.34 0.007,-0.34 ; -0.145,0.239 0.068,0.239 ; -0.115,-0.371 0.098,-0.371 ; -0.084,0.27 0.19,0.27 ; -0.054,-0.401 0.19,-0.401 ; -0.054,0.3 1.074,0.3 ; 0.007,-0.553 0.159,-0.553 ; 0.037,-0.523 0.159,-0.523 ; 0.037,-0.432 0.19,-0.432 ; 0.037,0.33 1.074,0.33 ; 0.068,-0.492 0.19,-0.492 ; 0.098,-0.889 0.251,-0.889 ; 0.098,-0.462 0.19,-0.462 ; 0.098,-0.127 0.19,-0.127 ; 0.098,-0.096 0.19,-0.096 ; 0.129,-0.858 0.281,-0.858 ; 0.129,-0.188 0.617,-0.188 ; 0.129,-0.157 0.251,-0.157 ; 0.129,-0.066 0.22,-0.066 ; 0.129,-0.035 0.251,-0.035 ; 0.129,-0.005 0.617,-0.005 ; 0.159,-0.828 0.312,-0.828 ; 0.159,-0.218 0.617,-0.218 ; 0.159,0.026 0.617,0.026 ; 0.19,-0.797 0.342,-0.797 ; 0.22,-0.767 0.373,-0.767 ; 0.251,-0.736 0.403,-0.736 ; 0.281,-0.706 0.434,-0.706 ; 0.312,-0.675 0.464,-0.675 ; 0.342,-0.645 0.495,-0.645 ; 0.373,-0.614 0.525,-0.614 ; 0.403,-0.584 0.647,-0.584 ; 0.434,-0.553 0.647,-0.553 ; 0.464,-0.523 0.647,-0.523 ; 0.495,-0.492 0.647,-0.492 ; 0.525,-0.462 0.647,-0.462 ; 0.525,-0.157 0.617,-0.157 ; 0.525,-0.127 0.617,-0.127 ; 0.525,-0.096 0.617,-0.096 ; 0.525,-0.066 0.617,-0.066 ; 0.525,-0.035 0.617,-0.035 ; 0.556,-0.95 1.074,-0.95 ; 0.556,-0.919 1.074,-0.919 ; 0.556,-0.889 0.647,-0.889 ; 0.556,-0.858 0.647,-0.858 ; 0.556,-0.828 0.647,-0.828 ; 0.556,-0.797 0.647,-0.797 ; 0.556,-0.767 0.647,-0.767 ; 0.556,-0.736 0.647,-0.736 ; 0.556,-0.706 0.647,-0.706 ; 0.556,-0.675 0.647,-0.675 ; 0.556,-0.645 0.647,-0.645 ; 0.556,-0.614 0.647,-0.614 ; 0.982,-0.889 1.074,-0.889 ; 0.982,-0.858 1.074,-0.858 ; 0.982,-0.828 1.074,-0.828 ; 0.982,-0.797 1.074,-0.797 ; 0.982,-0.767 1.074,-0.767 ; 0.982,-0.736 1.074,-0.736 ; 0.982,-0.706 1.074,-0.706 ; 0.982,-0.675 1.074,-0.675 ; 0.982,-0.645 1.074,-0.645 ; 0.982,-0.614 1.074,-0.614 ; 0.982,-0.584 1.074,-0.584 ; 0.982,-0.553 1.074,-0.553 ; 0.982,-0.523 1.074,-0.523 ; 0.982,-0.492 1.074,-0.492 ; 0.982,-0.462 1.074,-0.462 ; 0.982,-0.432 1.074,-0.432 ; 0.982,-0.401 1.074,-0.401 ; 0.982,-0.371 1.074,-0.371 ; 0.982,-0.34 1.074,-0.34 ; 0.982,-0.31 1.074,-0.31 ; 0.982,-0.279 1.074,-0.279 ; 0.982,-0.249 1.074,-0.249 ; 0.982,-0.218 1.074,-0.218 ; 0.982,-0.188 1.074,-0.188 ; 0.982,-0.157 1.074,-0.157 ; 0.982,-0.127 1.074,-0.127 ; 0.982,-0.096 1.074,-0.096 ; 0.982,-0.066 1.074,-0.066 ; 0.982,-0.035 1.074,-0.035 ; 0.982,-0.005 1.074,-0.005 ; 0.982,0.026 1.074,0.026 ; 0.982,0.056 1.074,0.056 ; 0.982,0.087 1.074,0.087 ; 0.982,0.117 1.074,0.117 ; 0.982,0.148 1.074,0.148 ; 0.982,0.178 1.074,0.178 ; 0.982,0.209 1.074,0.209 ; 0.982,0.239 1.074,0.239 ; 0.982,0.27 1.074,0.27 ; 1.104,-0.584 1.196,-0.584 ; 1.104,-0.553 1.196,-0.553 ; 1.104,-0.523 1.196,-0.523 ; 1.104,-0.492 1.196,-0.492 ; 1.104,-0.462 1.196,-0.462 ; 1.104,-0.432 1.196,-0.432 ; 1.104,-0.401 1.196,-0.401 ; 1.104,-0.371 1.196,-0.371 ; 1.104,-0.34 1.196,-0.34 ; 1.104,-0.31 1.196,-0.31 ; 1.104,-0.279 1.196,-0.279 ; 1.104,-0.249 1.196,-0.249 ; 1.104,-0.218 1.196,-0.218 ; 1.104,-0.188 1.196,-0.188 ; 1.104,-0.157 1.196,-0.157 ; 1.104,-0.127 1.196,-0.127 ; 1.104,-0.096 1.196,-0.096 ; 1.104,-0.066 1.196,-0.066 ; 1.104,-0.035 1.196,-0.035 ; 1.104,-0.005 1.196,-0.005 ; 1.104,0.026 1.196,0.026 ; 1.104,0.056 1.196,0.056 ; 1.104,0.087 1.196,0.087 ; 1.104,0.117 1.196,0.117 ; 1.104,0.148 1.196,0.148 ; 1.104,0.178 1.196,0.178 ; 1.104,0.209 1.196,0.209 ; 1.104,0.239 1.196,0.239 ; 1.104,0.27 1.196,0.27 ; 1.104,0.3 1.561,0.3 ; 1.104,0.33 1.561,0.33 ; 1.135,-0.675 1.257,-0.675 ; 1.135,-0.645 1.226,-0.645 ; 1.135,-0.614 1.226,-0.614 ; 1.165,-0.736 1.287,-0.736 ; 1.165,-0.706 1.257,-0.706 ; 1.196,-0.767 1.318,-0.767 ; 1.226,-0.797 1.348,-0.797 ; 1.257,-0.828 1.409,-0.828 ; 1.287,-0.858 1.47,-0.858 ; 1.318,-0.889 1.561,-0.889 ; 1.379,-0.919 